# Altium footprint library PCB SMD.PcbLib: 79 footprints (part 2 of 5)
Each footprint in its own frame and in the unit in brackets; x right, y up, seen from the top. Pads: shape width x height; smd on the part's side, far side on the other; paste and mask are expansions set on the pad; w line width, h text height; cw(c..) or ccw(c..) is an arc to the next point about the centre after c.
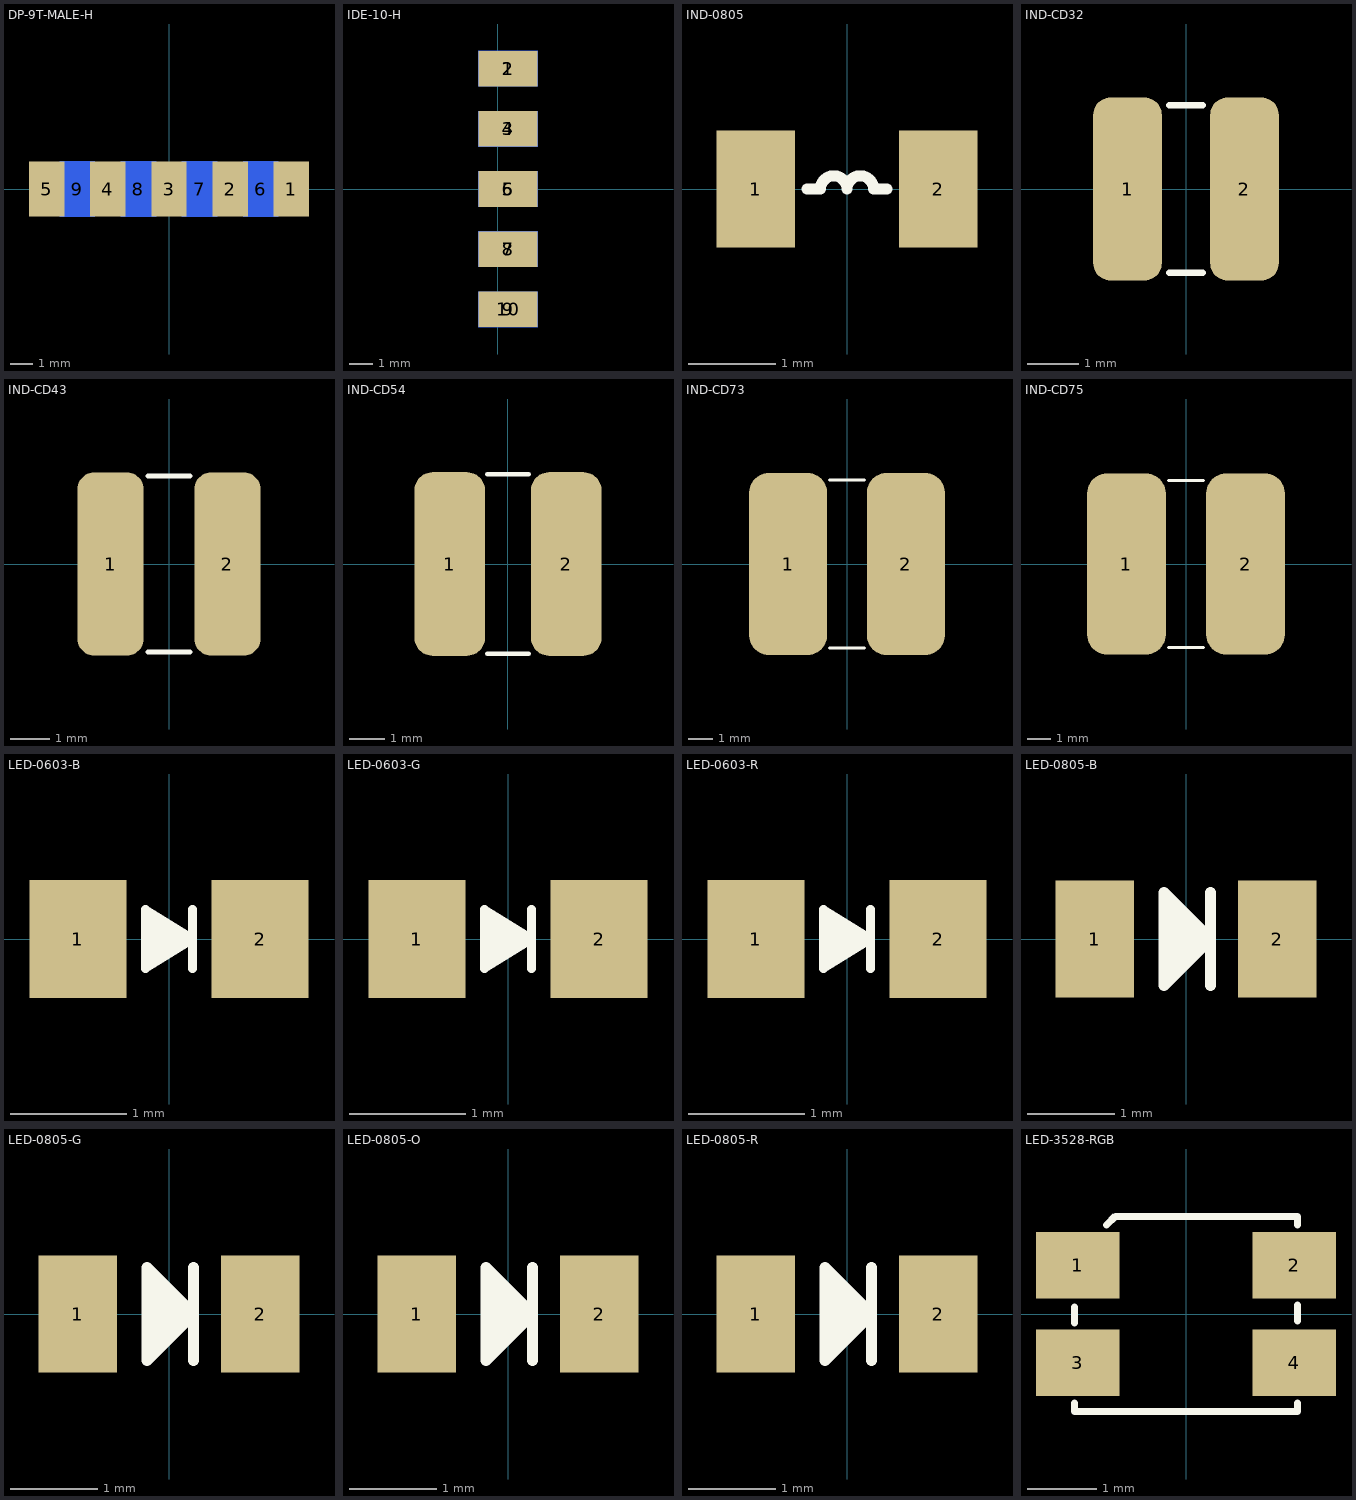
[diagram p1: the footprints below, top view; thin cyan lines are the x and y axes]

## DP-9T-MALE-H [mm]
pads (9):
  rect 1.6x2.5 smd: 1(5.54,0) 2(2.77,0) 3(0,0) 4(-2.77,0) 5(-5.54,0)
  rect 1.6x2.5 smd far side: 6(4.155,0) 7(1.385,0) 8(-1.385,0) 9(-4.155,0)
3D body "de09p064txlf.stp": height 6.11, standoff -6.31, extent -15.335,-0.967 15.335,13.33

## IDE-10-H [mm]
pads (10):
  rect 2.5x1.5 smd: 1(0.427,5.08) 3(0.427,2.54) 5(0.427,0) 7(0.427,-2.54) 9(0.427,-5.08)
  rect 2.5x1.5 smd far side: 2(0.427,5.08) 4(0.427,2.54) 6(0.427,0) 8(0.427,-2.54) 10(0.427,-5.08)
3D body "User Library-IDC-10M.STEP": height 4.2, standoff -4.9, extent -0.56,-10.15 11.84,10.15

## IND-0805 [mm]
pads (2):
  rect 0.9x1.35 smd: 1(-1.05,0) 2(1.05,0)
Top Overlay:
  lines w0.127: -0.457,0 -0.305,0 cw(c-0.152,0) 0,0 cw(c0.152,0) 0.305,0 0.457,0
3D body "L_0805.stp": height 0.61, standoff 0.01, extent -1,-0.625 1,0.625

## IND-CD32 [mm]
pads (2):
  rrect50% 1.35x3.6 smd: 1(-1.15,0) 2(1.15,0)
Top Overlay:
  lines w0.127: -0.33,-1.644 0.33,-1.644 ; -0.33,1.644 0.33,1.644
3D body "Inductor_CD32.STEP": height 2.3, standoff -0.17, extent -1.705,-1.644 1.704,1.644

## IND-CD43 [mm]
pads (2):
  rrect50% 1.7x4.7 smd: 1(-1.5,0) 2(1.5,0)
Top Overlay:
  lines w0.127: -0.533,-2.261 0.533,-2.261 ; -0.533,2.261 0.533,2.261
3D body "CD43_inductor.STEP": height 3.2, standoff 0, extent -2.194,-2.25 2.194,2.25

## IND-CD54 [mm]
pads (2):
  rrect50% 2x5.2 smd: 1(-1.65,0) 2(1.65,0)
Top Overlay:
  lines w0.127: -0.584,-2.54 0.584,-2.54 ; -0.584,2.54 0.584,2.54
3D body "User Library-sdr0503_stp.step": height 3, standoff 0, extent -2.5,-2.5 2.5,2.5

## IND-CD73 [mm]
pads (2):
  rrect50% 3.25x7.6 smd: 1(-2.45,0) 2(2.45,0)
Top Overlay:
  lines w0.127: -0.737,-3.505 0.737,-3.505 ; -0.737,3.505 0.737,3.505
3D body "SMD_Inductor_CD73.step": height 3.65, standoff -0.01, extent -3.9,-3.5 3.9,3.5

## IND-CD75 [mm]
pads (2):
  rrect50% 3.3x7.6 smd: 1(-2.5,0) 2(2.5,0)
Top Overlay:
  lines w0.127: -0.737,-3.505 0.737,-3.505 ; -0.737,3.505 0.737,3.505
3D body "SMD_Inductor_CD75.step": height 4.98, standoff -0.01, extent -3.9,-3.5 3.9,3.5

## LED-0603-B [mil] "SMDCHIP SIZE"
height 100
pads (2):
  rect 33x40 smd: 1(-31,0) 2(31,0)
Top Overlay:
  region: -8,10 8,0 -8,-10
  lines w3: 8,-10 8,10 ; -8,-10 8,0 -8,10 -8,-10
3D body "led.STEP": height 35.43, standoff 0, extent -33.47,-17.72 33.46,17.71

## LED-0603-G [mil] "SMDCHIP-SIZE"
height 100
pads (2):
  rect 33x40 smd: 1(-31,0) 2(31,0)
Top Overlay:
  region: -8,10 8,0 -8,-10
  lines w3: 8,-10 8,10 ; -8,-10 -8,10 8,0 -8,-10
3D body "User Library-LED_0603_G.STEP": height 23.62, standoff -0.08, extent -31.5,-15.75 31.49,15.74

## LED-0603-R [mil] "SMDCHIP SIZE"
height 100
pads (2):
  rect 33x40 smd: 1(-31,0) 2(31,0)
Top Overlay:
  region: -8,10 8,0 -8,-10
  lines w3: 8,-10 8,10 ; -8,-10 -8,10 8,0 -8,-10
3D body "LED-0603-RED.STEP": height 25.62, standoff 1.92, extent -31.5,-15.75 31.49,15.74

## LED-0805-B [mm]
pads (2):
  rect 0.9x1.35 smd: 1(-1.05,0) 2(1.05,0)
Top Overlay:
  region: -0.254,0.533 -0.254,-0.533 0.279,0
  lines w0.127: 0.279,-0.533 0.279,0.533 ; -0.254,-0.533 0.279,0 -0.254,0.533 -0.254,-0.533
3D body "LED-0805-B.STEP": height 1.1, standoff 0, extent -1.01,-0.625 1.01,0.625

## LED-0805-G [mm]
pads (2):
  rect 0.9x1.35 smd: 1(-1.05,0) 2(1.05,0)
Top Overlay:
  region: -0.254,0.533 -0.254,-0.533 0.279,0
  lines w0.127: 0.279,-0.533 0.279,0.533 ; -0.254,-0.533 -0.254,0.533 0.279,0 -0.254,-0.533
3D body "User Library-User Library-led_0805 GRE.STEP": height 1.1, standoff 0, extent -1.01,-0.625 1.01,0.625

## LED-0805-O [mm]
pads (2):
  rect 0.9x1.35 smd: 1(-1.05,0) 2(1.05,0)
Top Overlay:
  region: -0.254,0.533 -0.254,-0.533 0.279,0
  lines w0.127: 0.279,-0.533 0.279,0.533 ; -0.254,-0.533 -0.254,0.533 0.279,0 -0.254,-0.533
3D body "LED-0805-O.STEP": height 1.1, standoff 0, extent -1.01,-0.625 1.01,0.625

## LED-0805-R [mm]
pads (2):
  rect 0.9x1.35 smd: 1(-1.05,0) 2(1.05,0)
Top Overlay:
  region: -0.254,0.533 -0.254,-0.533 0.279,0
  lines w0.127: 0.279,-0.533 0.279,0.533 ; -0.254,-0.533 0.279,0 -0.254,0.533 -0.254,-0.533
3D body "LED-0805-R.STEP": height 1.1, standoff 0, extent -1.01,-0.625 1.01,0.625

## LED-3528-RGB [mm]
pads (4):
  rect 1.2x0.95 smd: 1(-1.549,0.7) 2(1.549,0.7) 3(-1.549,-0.7) 4(1.549,-0.7)
Top Overlay:
  lines w0.102: -1.6,-1.276 -1.6,-1.4 1.6,-1.4 1.6,-1.276 ; -1.6,-0.127 -1.6,0.102 ; -1.137,1.276 -1.013,1.4 1.6,1.4 1.6,1.276 ; 1.6,-0.102 1.6,0.127
3D body "User Library-KAA-3528.STEP": height 1.9, standoff 0, extent -1.75,-1.4 1.75,1.4